# Altium schematic symbol library Analog Devices Data Converters Digital-to-Analog Converters.SchLib: 2231 symbols (part 126 of 135) (continued)
## AD9788BSVZRL (continued)

## AD9789BBC
designator U?
14-Bit Digital-to-Analog Converter, 2400 Msps, -40 to +85 degC, BC-164-1, Tray; Generic Part Number: AD9789; Manufacturer: Analog Devices; PartNumber: AD9789BBC; # DAC Outputs: 1; Max V+: 3.47V; Op Pwr Diss: 1.7W; Resolution (Bits): 14; Settling Time: 13ns; Single Supply: No; DatasheetVersion: Rev.A; PackageVersion: 111808-A; PackageReference: BC-164-1; PackageDescription: 164-Ball Chip Scale Package Ball Grid Array [CSP_BGA]; Supplier 1: Digi-Key; Supplier Part Number 1: AD9789BBC-ND; Supplier 2: Mouser; Supplier Part Number 2: 584-AD9789BBC; Packing: Tray; RoHS: N; Mounting Technology: Surface Mount; Code_JEDEC: MO-219*; ComponentLink1Description: Manufacturer URL; ComponentLink1URL: http://www.analog.com/en/index.html; ComponentLink2Description: Datasheet; ComponentLink2URL: http://www.analog.com/static/imported-files/data_sheets/AD9789.pdf; ComponentLink3Description: Package Specification; ComponentLink3URL: http://www.analog.com/static/imported-files/packages/PKG_PDF/CSPBGA%20(BC)/BC_164_1.pdf; ComponentLink4Description: Product URL; ComponentLink4URL: http://www.analog.com/en/digital-to-analog-converters/da-converters/ad9789/products/product.html
footprint BC-164-1 (BGA, 164-Leads, Body 12x12mm, Pitch 0.8mm)
part A pins: A7 IOUTN (out) "DAC Negative Output Current.", A8 IOUTP (out) "DAC Positive Output Current.", L5 D31/D15P (in) "CMOS/LVDS Data Input.", L6 D27/D13P (in) "CMOS/LVDS Data Input.", L7 D23/D11P (in) "CMOS/LVDS Data Input.", L8 D19/D9P (in) "CMOS/LVDS Data Input.", L9 D15/D7P (in) "CMOS/LVDS Data Input.", L10 D11/D5P (in) "CMOS/LVDS Data Input.", L11 D7/D3P (in) "CMOS/LVDS Data Input.", L12 D3/D1P (in) "CMOS/LVDS Data Input.", M5 D30/D15N (in) "CMOS/LVDS Data Input.", M6 D26/D13N (in) "CMOS/LVDS Data Input.", M7 D22/D11N (in) "CMOS/LVDS Data Input.", M8 D18/D9N (in) "CMOS/LVDS Data Input.", M9 D14/D7N (in) "CMOS/LVDS Data Input.", M10 D10/D5N (in) "CMOS/LVDS Data Input.", M11 D6/D3N (in) "CMOS/LVDS Data Input.", M12 D2/D1N (in) "CMOS/LVDS Data Input.", N5 D29/D14P (in) "CMOS/LVDS Data Input.", N6 D25/D12P (in) "CMOS/LVDS Data Input.", N7 D21/D10P (in) "CMOS/LVDS Data Input.", N8 D17/D8P (in) "CMOS/LVDS Data Input.", N9 D13/D6P (in) "CMOS/LVDS Data Input.", N10 D9/D4P (in) "CMOS/LVDS Data Input.", N11 D5/D2P (in) "CMOS/LVDS Data Input.", N12 D1/D0P (in) "CMOS/LVDS Data Input.", P5 D28/D14N (in) "CMOS/LVDS Data Input.", P6 D24/D12N (in) "CMOS/LVDS Data Input.", P7 D20/D10N (in) "CMOS/LVDS Data Input.", P8 D16/D8N (in) "CMOS/LVDS Data Input.", P9 D12/D6N (in) "CMOS/LVDS Data Input.", P10 D8/D4N (in) "CMOS/LVDS Data Input.", P11 D4/D2N (in) "CMOS/LVDS Data Input.", P12 D0/D0N (in) "CMOS/LVDS Data Input."
part B pins: A14 NC "No Connect. Leave floating.", B14 I120 "Tie this pin to analog ground with a 10 k ohm resistor to generate a 120 uA reference current.", C1 CLKN (in) "Negative DAC Clock Input (DACCLK).", C14 VREF (io) "Band Gap Voltage Reference I/O. Decouple to analog ground with a 1 nF capacitor. Output impedance is approximately 5 k ohm.", D1 CLKP (in) "Positive DAC Clock Input (DACCLK).", D14 IPTAT "Factory Test Pin. Output current, proportional to absolute temperature, is approximately 10 uA at 25 dgeC with a slope of approximately 20 nA/ degC.", L1 ~{CS} (in) "Active Low Chip Select for SPI.", L2 NC "Not Used. Leave unconnected.", L3 NC "Not Used. Leave unconnected.", L4 P1/PARP (in) "CMOS/LVDS Parity Bit.", L13 FSP (out) "Positive LVDS Frame Sync (FSP) for Data Bus.", L14 CMOS_BUS (in) "Active High Input. Configures data bus for CMOS inputs. Low input configures data bus to accept LVDS inputs.", M1 SCLK (in) "Qualifying Clock for SPI.", M2 NC "Not Used. Leave unconnected.", M3 NC "Not Used. Leave unconnected.", M4 P0/PARN (in) "CMOS/LVDS Parity Bit.", M13 FSN (out) "Negative LVDS Frame Sync (FSN) for Data Bus.", M14 CMOS_CTRL (in) "Active High Input. Enables CMOS_DCO and CMOS_FS signals and disables DCOP/DCON and FSP/FSN signals. Low input disables CMOS_DCO and CMOS_FS signals and enables DCOP/DCON and FSP/FSN signals.", N1 SDO (hiz) "Serial Data Output for SPI.", N2 RESET (in) "Active High Input. Resets the AD9789.", N3 NC "Not Used. Leave unconnected.", N4 NC "Not Used. Leave unconnected.", N13 DCOP (out) "Positive LVDS Data Clock Output (DCOP) for Data Bus.", N14 CMOS_FS (in) "CMOS Frame Sync for Data Bus.", P1 SDIO (io) "Serial Data Input/Output for SPI.", P2 ~{IRQ} (oc) "Active Low, Open-Drain Interrupt Request Output. Pull up to DVDD33 with a 10 k ohm resistor.", P3 NC "Not Used. Leave unconnected.", P4 NC "Not Used. Leave unconnected.", P13 DCON (out) "Negative LVDS Data Clock Output (DCON) for Data Bus.", P14 CMOS_DCO (out) "CMOS Data Clock Output for Data Bus."
part C pins: A4 CVDD18 (power) "1.8 V Clock Supply.", A5 CVDD18 (power) "1.8 V Clock Supply.", A12 AVDD33 (power) "3.3 V Analog Supply.", A13 AVDD33 (power) "3.3 V Analog Supply.", B4 CVDD18 (power) "1.8 V Clock Supply.", B5 CVDD18 (power) "1.8 V Clock Supply.", B12 AVDD33 (power) "3.3 V Analog Supply.", B13 AVDD33 (power) "3.3 V Analog Supply.", C4 CVDD18 (power) "1.8 V Clock Supply.", C5 CVDD18 (power) "1.8 V Clock Supply.", C12 AVDD33 (power) "3.3 V Analog Supply.", C13 AVDD33 (power) "3.3 V Analog Supply.", D4 CVDD18 (power) "1.8 V Clock Supply.", D5 CVDD18 (power) "1.8 V Clock Supply.", D12 AVDD33 (power) "3.3 V Analog Supply.", D13 AVDD33 (power) "3.3 V Analog Supply.", E11 DVDD18 (power) "1.8 V Digital Supply.", E12 DVDD18 (power) "1.8 V Digital Supply.", G1 DVDD15 (power) "1.5 V Digital Supply.", G2 DVDD15 (power) "1.5 V Digital Supply.", G3 DVDD15 (power) "1.5 V Digital Supply.", G4 DVDD15 (power) "1.5 V Digital Supply.", G7 DVDD15 (power) "1.5 V Digital Supply.", G8 DVDD15 (power) "1.5 V Digital Supply.", G11 DVDD15 (power) "1.5 V Digital Supply.", G12 DVDD15 (power) "1.5 V Digital Supply.", G13 DVDD15 (power) "1.5 V Digital Supply.", G14 DVDD15 (power) "1.5 V Digital Supply.", K1 DVDD33 (power) "3.3 V Digital Supply.", K2 DVDD33 (power) "3.3 V Digital Supply.", K3 DVDD33 (power) "3.3 V Digital Supply.", K4 DVDD33 (power) "3.3 V Digital Supply.", K11 DVDD33 (power) "3.3 V Digital Supply.", K12 DVDD33 (power) "3.3 V Digital Supply.", K13 DVDD33 (power) "3.3 V Digital Supply.", K14 DVDD33 (power) "3.3 V Digital Supply."
part D pins: A1 AVSS (power) "Analog Supply Ground.", A2 AVSS (power) "Analog Supply Ground.", A3 AVSS (power) "Analog Supply Ground.", A6 AVSS (power) "Analog Supply Ground.", A9 AVSS (power) "Analog Supply Ground.", A10 AVSS (power) "Analog Supply Ground.", A11 AVSS (power) "Analog Supply Ground.", B1 AVSS (power) "Analog Supply Ground.", B2 AVSS (power) "Analog Supply Ground.", B3 AVSS (power) "Analog Supply Ground.", B6 AVSS (power) "Analog Supply Ground.", B7 AVSS (power) "Analog Supply Ground.", B8 AVSS (power) "Analog Supply Ground.", B9 AVSS (power) "Analog Supply Ground.", B10 AVSS (power) "Analog Supply Ground.", B11 AVSS (power) "Analog Supply Ground.", C2 AVSS (power) "Analog Supply Ground.", C3 AVSS (power) "Analog Supply Ground.", C6 AVSS (power) "Analog Supply Ground.", C7 AVSS (power) "Analog Supply Ground.", C8 AVSS (power) "Analog Supply Ground.", C9 AVSS (power) "Analog Supply Ground.", C10 AVSS (power) "Analog Supply Ground.", C11 AVSS (power) "Analog Supply Ground.", D2 AVSS (power) "Analog Supply Ground.", D3 AVSS (power) "Analog Supply Ground.", D6 AVSS (power) "Analog Supply Ground.", D7 AVSS (power) "Analog Supply Ground.", D8 AVSS (power) "Analog Supply Ground.", D9 AVSS (power) "Analog Supply Ground.", D10 AVSS (power) "Analog Supply Ground.", D11 AVSS (power) "Analog Supply Ground.", E1 AVSS (power) "Analog Supply Ground.", E2 AVSS (power) "Analog Supply Ground.", E3 AVSS (power) "Analog Supply Ground.", E4 AVSS (power) "Analog Supply Ground.", E13 AVSS (power) "Analog Supply Ground.", E14 AVSS (power) "Analog Supply Ground.", F1 AVSS (power) "Analog Supply Ground.", F2 AVSS (power) "Analog Supply Ground.", F3 AVSS (power) "Analog Supply Ground.", F4 AVSS (power) "Analog Supply Ground.", F11 AVSS (power) "Analog Supply Ground.", F12 AVSS (power) "Analog Supply Ground.", F13 AVSS (power) "Analog Supply Ground.", F14 AVSS (power) "Analog Supply Ground.", H1 DVSS (power) "Digital Supply Ground.", H2 DVSS (power) "Digital Supply Ground.", H3 DVSS (power) "Digital Supply Ground.", H4 DVSS (power) "Digital Supply Ground.", H7 DVSS (power) "Digital Supply Ground.", H8 DVSS (power) "Digital Supply Ground.", H11 DVSS (power) "Digital Supply Ground.", H12 DVSS (power) "Digital Supply Ground.", H13 DVSS (power) "Digital Supply Ground.", H14 DVSS (power) "Digital Supply Ground.", J1 DVSS (power) "Digital Supply Ground.", J2 DVSS (power) "Digital Supply Ground.", J3 DVSS (power) "Digital Supply Ground.", J4 DVSS (power) "Digital Supply Ground.", J11 DVSS (power) "Digital Supply Ground.", J12 DVSS (power) "Digital Supply Ground.", J13 DVSS (power) "Digital Supply Ground.", J14 DVSS (power) "Digital Supply Ground."

## AD9789BBCRL
designator U?
14-Bit Digital-to-Analog Converter, 2400 Msps, -40 to +85 degC, BC-164-1, Reel; Generic Part Number: AD9789; Manufacturer: Analog Devices; PartNumber: AD9789BBCRL; # DAC Outputs: 1; Max V+: 3.47V; Op Pwr Diss: 1.7W; Resolution (Bits): 14; Settling Time: 13ns; Single Supply: No; DatasheetVersion: Rev.A; PackageVersion: 111808-A; PackageReference: BC-164-1; PackageDescription: 164-Ball Chip Scale Package Ball Grid Array [CSP_BGA]; Supplier 1: Digi-Key; Supplier Part Number 1: AD9789BBCRL-ND; Supplier 2: Mouser; Supplier Part Number 2: 584-AD9789BBCR; Packing: Reel; RoHS: N; Mounting Technology: Surface Mount; Code_JEDEC: MO-219*; ComponentLink1Description: Manufacturer URL; ComponentLink1URL: http://www.analog.com/en/index.html; ComponentLink2Description: Datasheet; ComponentLink2URL: http://www.analog.com/static/imported-files/data_sheets/AD9789.pdf; ComponentLink3Description: Package Specification; ComponentLink3URL: http://www.analog.com/static/imported-files/packages/PKG_PDF/CSPBGA%20(BC)/BC_164_1.pdf; ComponentLink4Description: Product URL; ComponentLink4URL: http://www.analog.com/en/digital-to-analog-converters/da-converters/ad9789/products/product.html
footprint BC-164-1 (BGA, 164-Leads, Body 12x12mm, Pitch 0.8mm)
part A pins: A7 IOUTN (out) "DAC Negative Output Current.", A8 IOUTP (out) "DAC Positive Output Current.", L5 D31/D15P (in) "CMOS/LVDS Data Input.", L6 D27/D13P (in) "CMOS/LVDS Data Input.", L7 D23/D11P (in) "CMOS/LVDS Data Input.", L8 D19/D9P (in) "CMOS/LVDS Data Input.", L9 D15/D7P (in) "CMOS/LVDS Data Input.", L10 D11/D5P (in) "CMOS/LVDS Data Input.", L11 D7/D3P (in) "CMOS/LVDS Data Input.", L12 D3/D1P (in) "CMOS/LVDS Data Input.", M5 D30/D15N (in) "CMOS/LVDS Data Input.", M6 D26/D13N (in) "CMOS/LVDS Data Input.", M7 D22/D11N (in) "CMOS/LVDS Data Input.", M8 D18/D9N (in) "CMOS/LVDS Data Input.", M9 D14/D7N (in) "CMOS/LVDS Data Input.", M10 D10/D5N (in) "CMOS/LVDS Data Input.", M11 D6/D3N (in) "CMOS/LVDS Data Input.", M12 D2/D1N (in) "CMOS/LVDS Data Input.", N5 D29/D14P (in) "CMOS/LVDS Data Input.", N6 D25/D12P (in) "CMOS/LVDS Data Input.", N7 D21/D10P (in) "CMOS/LVDS Data Input.", N8 D17/D8P (in) "CMOS/LVDS Data Input.", N9 D13/D6P (in) "CMOS/LVDS Data Input.", N10 D9/D4P (in) "CMOS/LVDS Data Input.", N11 D5/D2P (in) "CMOS/LVDS Data Input.", N12 D1/D0P (in) "CMOS/LVDS Data Input.", P5 D28/D14N (in) "CMOS/LVDS Data Input.", P6 D24/D12N (in) "CMOS/LVDS Data Input.", P7 D20/D10N (in) "CMOS/LVDS Data Input.", P8 D16/D8N (in) "CMOS/LVDS Data Input.", P9 D12/D6N (in) "CMOS/LVDS Data Input.", P10 D8/D4N (in) "CMOS/LVDS Data Input.", P11 D4/D2N (in) "CMOS/LVDS Data Input.", P12 D0/D0N (in) "CMOS/LVDS Data Input."
part B pins: A14 NC "No Connect. Leave floating.", B14 I120 "Tie this pin to analog ground with a 10 k ohm resistor to generate a 120 uA reference current.", C1 CLKN (in) "Negative DAC Clock Input (DACCLK).", C14 VREF (io) "Band Gap Voltage Reference I/O. Decouple to analog ground with a 1 nF capacitor. Output impedance is approximately 5 k ohm.", D1 CLKP (in) "Positive DAC Clock Input (DACCLK).", D14 IPTAT "Factory Test Pin. Output current, proportional to absolute temperature, is approximately 10 uA at 25 dgeC with a slope of approximately 20 nA/ degC.", L1 ~{CS} (in) "Active Low Chip Select for SPI.", L2 NC "Not Used. Leave unconnected.", L3 NC "Not Used. Leave unconnected.", L4 P1/PARP (in) "CMOS/LVDS Parity Bit.", L13 FSP (out) "Positive LVDS Frame Sync (FSP) for Data Bus.", L14 CMOS_BUS (in) "Active High Input. Configures data bus for CMOS inputs. Low input configures data bus to accept LVDS inputs.", M1 SCLK (in) "Qualifying Clock for SPI.", M2 NC "Not Used. Leave unconnected.", M3 NC "Not Used. Leave unconnected.", M4 P0/PARN (in) "CMOS/LVDS Parity Bit.", M13 FSN (out) "Negative LVDS Frame Sync (FSN) for Data Bus.", M14 CMOS_CTRL (in) "Active High Input. Enables CMOS_DCO and CMOS_FS signals and disables DCOP/DCON and FSP/FSN signals. Low input disables CMOS_DCO and CMOS_FS signals and enables DCOP/DCON and FSP/FSN signals.", N1 SDO (hiz) "Serial Data Output for SPI.", N2 RESET (in) "Active High Input. Resets the AD9789.", N3 NC "Not Used. Leave unconnected.", N4 NC "Not Used. Leave unconnected.", N13 DCOP (out) "Positive LVDS Data Clock Output (DCOP) for Data Bus.", N14 CMOS_FS (in) "CMOS Frame Sync for Data Bus.", P1 SDIO (io) "Serial Data Input/Output for SPI.", P2 ~{IRQ} (oc) "Active Low, Open-Drain Interrupt Request Output. Pull up to DVDD33 with a 10 k ohm resistor.", P3 NC "Not Used. Leave unconnected.", P4 NC "Not Used. Leave unconnected.", P13 DCON (out) "Negative LVDS Data Clock Output (DCON) for Data Bus.", P14 CMOS_DCO (out) "CMOS Data Clock Output for Data Bus."
part C pins: A4 CVDD18 (power) "1.8 V Clock Supply.", A5 CVDD18 (power) "1.8 V Clock Supply.", A12 AVDD33 (power) "3.3 V Analog Supply.", A13 AVDD33 (power) "3.3 V Analog Supply.", B4 CVDD18 (power) "1.8 V Clock Supply.", B5 CVDD18 (power) "1.8 V Clock Supply.", B12 AVDD33 (power) "3.3 V Analog Supply.", B13 AVDD33 (power) "3.3 V Analog Supply.", C4 CVDD18 (power) "1.8 V Clock Supply.", C5 CVDD18 (power) "1.8 V Clock Supply.", C12 AVDD33 (power) "3.3 V Analog Supply.", C13 AVDD33 (power) "3.3 V Analog Supply.", D4 CVDD18 (power) "1.8 V Clock Supply.", D5 CVDD18 (power) "1.8 V Clock Supply.", D12 AVDD33 (power) "3.3 V Analog Supply.", D13 AVDD33 (power) "3.3 V Analog Supply.", E11 DVDD18 (power) "1.8 V Digital Supply.", E12 DVDD18 (power) "1.8 V Digital Supply.", G1 DVDD15 (power) "1.5 V Digital Supply.", G2 DVDD15 (power) "1.5 V Digital Supply.", G3 DVDD15 (power) "1.5 V Digital Supply.", G4 DVDD15 (power) "1.5 V Digital Supply.", G7 DVDD15 (power) "1.5 V Digital Supply.", G8 DVDD15 (power) "1.5 V Digital Supply.", G11 DVDD15 (power) "1.5 V Digital Supply.", G12 DVDD15 (power) "1.5 V Digital Supply.", G13 DVDD15 (power) "1.5 V Digital Supply.", G14 DVDD15 (power) "1.5 V Digital Supply.", K1 DVDD33 (power) "3.3 V Digital Supply.", K2 DVDD33 (power) "3.3 V Digital Supply.", K3 DVDD33 (power) "3.3 V Digital Supply.", K4 DVDD33 (power) "3.3 V Digital Supply.", K11 DVDD33 (power) "3.3 V Digital Supply.", K12 DVDD33 (power) "3.3 V Digital Supply.", K13 DVDD33 (power) "3.3 V Digital Supply.", K14 DVDD33 (power) "3.3 V Digital Supply."
part D pins: A1 AVSS (power) "Analog Supply Ground.", A2 AVSS (power) "Analog Supply Ground.", A3 AVSS (power) "Analog Supply Ground.", A6 AVSS (power) "Analog Supply Ground.", A9 AVSS (power) "Analog Supply Ground.", A10 AVSS (power) "Analog Supply Ground.", A11 AVSS (power) "Analog Supply Ground.", B1 AVSS (power) "Analog Supply Ground.", B2 AVSS (power) "Analog Supply Ground.", B3 AVSS (power) "Analog Supply Ground.", B6 AVSS (power) "Analog Supply Ground.", B7 AVSS (power) "Analog Supply Ground.", B8 AVSS (power) "Analog Supply Ground.", B9 AVSS (power) "Analog Supply Ground.", B10 AVSS (power) "Analog Supply Ground.", B11 AVSS (power) "Analog Supply Ground.", C2 AVSS (power) "Analog Supply Ground.", C3 AVSS (power) "Analog Supply Ground.", C6 AVSS (power) "Analog Supply Ground.", C7 AVSS (power) "Analog Supply Ground.", C8 AVSS (power) "Analog Supply Ground.", C9 AVSS (power) "Analog Supply Ground.", C10 AVSS (power) "Analog Supply Ground.", C11 AVSS (power) "Analog Supply Ground.", D2 AVSS (power) "Analog Supply Ground.", D3 AVSS (power) "Analog Supply Ground.", D6 AVSS (power) "Analog Supply Ground.", D7 AVSS (power) "Analog Supply Ground.", D8 AVSS (power) "Analog Supply Ground.", D9 AVSS (power) "Analog Supply Ground.", D10 AVSS (power) "Analog Supply Ground.", D11 AVSS (power) "Analog Supply Ground.", E1 AVSS (power) "Analog Supply Ground.", E2 AVSS (power) "Analog Supply Ground.", E3 AVSS (power) "Analog Supply Ground.", E4 AVSS (power) "Analog Supply Ground.", E13 AVSS (power) "Analog Supply Ground.", E14 AVSS (power) "Analog Supply Ground.", F1 AVSS (power) "Analog Supply Ground.", F2 AVSS (power) "Analog Supply Ground.", F3 AVSS (power) "Analog Supply Ground.", F4 AVSS (power) "Analog Supply Ground.", F11 AVSS (power) "Analog Supply Ground.", F12 AVSS (power) "Analog Supply Ground.", F13 AVSS (power) "Analog Supply Ground.", F14 AVSS (power) "Analog Supply Ground.", H1 DVSS (power) "Digital Supply Ground.", H2 DVSS (power) "Digital Supply Ground.", H3 DVSS (power) "Digital Supply Ground.", H4 DVSS (power) "Digital Supply Ground.", H7 DVSS (power) "Digital Supply Ground.", H8 DVSS (power) "Digital Supply Ground.", H11 DVSS (power) "Digital Supply Ground.", H12 DVSS (power) "Digital Supply Ground.", H13 DVSS (power) "Digital Supply Ground.", H14 DVSS (power) "Digital Supply Ground.", J1 DVSS (power) "Digital Supply Ground.", J2 DVSS (power) "Digital Supply Ground.", J3 DVSS (power) "Digital Supply Ground.", J4 DVSS (power) "Digital Supply Ground.", J11 DVSS (power) "Digital Supply Ground.", J12 DVSS (power) "Digital Supply Ground.", J13 DVSS (power) "Digital Supply Ground.", J14 DVSS (power) "Digital Supply Ground."

## AD9789BBCZ
designator U?
Single 14-Bit Digital-to-Analog Converter, 2400 Msps, -40 to +85 degC, BC-164-1, Pb-Free, Tray; Generic Part Number: AD9789; Manufacturer: Analog Devices; PartNumber: AD9789BBCZ; # DAC Outputs: 1; Max V+: 3.47V; Op Pwr Diss: 1.7W; Resolution (Bits): 14; Settling Time: 13ns; Single Supply: No; DatasheetVersion: Rev.A; PackageVersion: 111808-A; PackageReference: BC-164-1; PackageDescription: 164-Ball Chip Scale Package Ball Grid Array [CSP_BGA]; Supplier 1: Digi-Key; Supplier Part Number 1: AD9789BBCZ-ND; Supplier 2: Farnell; Supplier Part Number 2: 2074860; Supplier 3: Newark; Supplier Part Number 3: 05R6618; Supplier 4: Mouser; Supplier Part Number 4: 584-AD9789BBCZ; Packing: Tray; RoHS: Y; Mounting Technology: Surface Mount; Code_JEDEC: MO-219*; ComponentLink1Description: Manufacturer URL; ComponentLink1URL: http://www.analog.com/en/index.html; ComponentLink2Description: Datasheet; ComponentLink2URL: http://www.analog.com/static/imported-files/data_sheets/AD9789.pdf; ComponentLink3Description: Package Specification; ComponentLink3URL: http://www.analog.com/static/imported-files/packages/PKG_PDF/CSPBGA%20(BC)/BC_164_1.pdf; ComponentLink4Description: Product URL; ComponentLink4URL: http://www.analog.com/en/digital-to-analog-converters/da-converters/ad9789/products/product.html
footprint BC-164-1 (BGA, 164-Leads, Body 12x12mm, Pitch 0.8mm)
part A pins: A7 IOUTN (out) "DAC Negative Output Current.", A8 IOUTP (out) "DAC Positive Output Current.", L5 D31/D15P (in) "CMOS/LVDS Data Input.", L6 D27/D13P (in) "CMOS/LVDS Data Input.", L7 D23/D11P (in) "CMOS/LVDS Data Input.", L8 D19/D9P (in) "CMOS/LVDS Data Input.", L9 D15/D7P (in) "CMOS/LVDS Data Input.", L10 D11/D5P (in) "CMOS/LVDS Data Input.", L11 D7/D3P (in) "CMOS/LVDS Data Input.", L12 D3/D1P (in) "CMOS/LVDS Data Input.", M5 D30/D15N (in) "CMOS/LVDS Data Input.", M6 D26/D13N (in) "CMOS/LVDS Data Input.", M7 D22/D11N (in) "CMOS/LVDS Data Input.", M8 D18/D9N (in) "CMOS/LVDS Data Input.", M9 D14/D7N (in) "CMOS/LVDS Data Input.", M10 D10/D5N (in) "CMOS/LVDS Data Input.", M11 D6/D3N (in) "CMOS/LVDS Data Input.", M12 D2/D1N (in) "CMOS/LVDS Data Input.", N5 D29/D14P (in) "CMOS/LVDS Data Input.", N6 D25/D12P (in) "CMOS/LVDS Data Input.", N7 D21/D10P (in) "CMOS/LVDS Data Input.", N8 D17/D8P (in) "CMOS/LVDS Data Input.", N9 D13/D6P (in) "CMOS/LVDS Data Input.", N10 D9/D4P (in) "CMOS/LVDS Data Input.", N11 D5/D2P (in) "CMOS/LVDS Data Input.", N12 D1/D0P (in) "CMOS/LVDS Data Input.", P5 D28/D14N (in) "CMOS/LVDS Data Input.", P6 D24/D12N (in) "CMOS/LVDS Data Input.", P7 D20/D10N (in) "CMOS/LVDS Data Input.", P8 D16/D8N (in) "CMOS/LVDS Data Input.", P9 D12/D6N (in) "CMOS/LVDS Data Input.", P10 D8/D4N (in) "CMOS/LVDS Data Input.", P11 D4/D2N (in) "CMOS/LVDS Data Input.", P12 D0/D0N (in) "CMOS/LVDS Data Input."
part B pins: A14 NC "No Connect. Leave floating.", B14 I120 "Tie this pin to analog ground with a 10 k ohm resistor to generate a 120 uA reference current.", C1 CLKN (in) "Negative DAC Clock Input (DACCLK).", C14 VREF (io) "Band Gap Voltage Reference I/O. Decouple to analog ground with a 1 nF capacitor. Output impedance is approximately 5 k ohm.", D1 CLKP (in) "Positive DAC Clock Input (DACCLK).", D14 IPTAT "Factory Test Pin. Output current, proportional to absolute temperature, is approximately 10 uA at 25 dgeC with a slope of approximately 20 nA/ degC.", L1 ~{CS} (in) "Active Low Chip Select for SPI.", L2 NC "Not Used. Leave unconnected.", L3 NC "Not Used. Leave unconnected.", L4 P1/PARP (in) "CMOS/LVDS Parity Bit.", L13 FSP (out) "Positive LVDS Frame Sync (FSP) for Data Bus.", L14 CMOS_BUS (in) "Active High Input. Configures data bus for CMOS inputs. Low input configures data bus to accept LVDS inputs.", M1 SCLK (in) "Qualifying Clock for SPI.", M2 NC "Not Used. Leave unconnected.", M3 NC "Not Used. Leave unconnected.", M4 P0/PARN (in) "CMOS/LVDS Parity Bit.", M13 FSN (out) "Negative LVDS Frame Sync (FSN) for Data Bus.", M14 CMOS_CTRL (in) "Active High Input. Enables CMOS_DCO and CMOS_FS signals and disables DCOP/DCON and FSP/FSN signals. Low input disables CMOS_DCO and CMOS_FS signals and enables DCOP/DCON and FSP/FSN signals.", N1 SDO (hiz) "Serial Data Output for SPI.", N2 RESET (in) "Active High Input. Resets the AD9789.", N3 NC "Not Used. Leave unconnected.", N4 NC "Not Used. Leave unconnected.", N13 DCOP (out) "Positive LVDS Data Clock Output (DCOP) for Data Bus.", N14 CMOS_FS (in) "CMOS Frame Sync for Data Bus.", P1 SDIO (io) "Serial Data Input/Output for SPI.", P2 ~{IRQ} (oc) "Active Low, Open-Drain Interrupt Request Output. Pull up to DVDD33 with a 10 k ohm resistor.", P3 NC "Not Used. Leave unconnected.", P4 NC "Not Used. Leave unconnected.", P13 DCON (out) "Negative LVDS Data Clock Output (DCON) for Data Bus.", P14 CMOS_DCO (out) "CMOS Data Clock Output for Data Bus."
part C pins: A4 CVDD18 (power) "1.8 V Clock Supply.", A5 CVDD18 (power) "1.8 V Clock Supply.", A12 AVDD33 (power) "3.3 V Analog Supply.", A13 AVDD33 (power) "3.3 V Analog Supply.", B4 CVDD18 (power) "1.8 V Clock Supply.", B5 CVDD18 (power) "1.8 V Clock Supply.", B12 AVDD33 (power) "3.3 V Analog Supply.", B13 AVDD33 (power) "3.3 V Analog Supply.", C4 CVDD18 (power) "1.8 V Clock Supply.", C5 CVDD18 (power) "1.8 V Clock Supply.", C12 AVDD33 (power) "3.3 V Analog Supply.", C13 AVDD33 (power) "3.3 V Analog Supply.", D4 CVDD18 (power) "1.8 V Clock Supply.", D5 CVDD18 (power) "1.8 V Clock Supply.", D12 AVDD33 (power) "3.3 V Analog Supply.", D13 AVDD33 (power) "3.3 V Analog Supply.", E11 DVDD18 (power) "1.8 V Digital Supply.", E12 DVDD18 (power) "1.8 V Digital Supply.", G1 DVDD15 (power) "1.5 V Digital Supply.", G2 DVDD15 (power) "1.5 V Digital Supply.", G3 DVDD15 (power) "1.5 V Digital Supply.", G4 DVDD15 (power) "1.5 V Digital Supply.", G7 DVDD15 (power) "1.5 V Digital Supply.", G8 DVDD15 (power) "1.5 V Digital Supply.", G11 DVDD15 (power) "1.5 V Digital Supply.", G12 DVDD15 (power) "1.5 V Digital Supply.", G13 DVDD15 (power) "1.5 V Digital Supply.", G14 DVDD15 (power) "1.5 V Digital Supply.", K1 DVDD33 (power) "3.3 V Digital Supply.", K2 DVDD33 (power) "3.3 V Digital Supply.", K3 DVDD33 (power) "3.3 V Digital Supply.", K4 DVDD33 (power) "3.3 V Digital Supply.", K11 DVDD33 (power) "3.3 V Digital Supply.", K12 DVDD33 (power) "3.3 V Digital Supply.", K13 DVDD33 (power) "3.3 V Digital Supply.", K14 DVDD33 (power) "3.3 V Digital Supply."
part D pins: A1 AVSS (power) "Analog Supply Ground.", A2 AVSS (power) "Analog Supply Ground.", A3 AVSS (power) "Analog Supply Ground.", A6 AVSS (power) "Analog Supply Ground.", A9 AVSS (power) "Analog Supply Ground.", A10 AVSS (power) "Analog Supply Ground.", A11 AVSS (power) "Analog Supply Ground.", B1 AVSS (power) "Analog Supply Ground.", B2 AVSS (power) "Analog Supply Ground.", B3 AVSS (power) "Analog Supply Ground.", B6 AVSS (power) "Analog Supply Ground.", B7 AVSS (power) "Analog Supply Ground.", B8 AVSS (power) "Analog Supply Ground.", B9 AVSS (power) "Analog Supply Ground.", B10 AVSS (power) "Analog Supply Ground.", B11 AVSS (power) "Analog Supply Ground.", C2 AVSS (power) "Analog Supply Ground.", C3 AVSS (power) "Analog Supply Ground.", C6 AVSS (power) "Analog Supply Ground.", C7 AVSS (power) "Analog Supply Ground.", C8 AVSS (power) "Analog Supply Ground.", C9 AVSS (power) "Analog Supply Ground.", C10 AVSS (power) "Analog Supply Ground.", C11 AVSS (power) "Analog Supply Ground.", D2 AVSS (power) "Analog Supply Ground.", D3 AVSS (power) "Analog Supply Ground.", D6 AVSS (power) "Analog Supply Ground.", D7 AVSS (power) "Analog Supply Ground.", D8 AVSS (power) "Analog Supply Ground.", D9 AVSS (power) "Analog Supply Ground.", D10 AVSS (power) "Analog Supply Ground.", D11 AVSS (power) "Analog Supply Ground.", E1 AVSS (power) "Analog Supply Ground.", E2 AVSS (power) "Analog Supply Ground.", E3 AVSS (power) "Analog Supply Ground.", E4 AVSS (power) "Analog Supply Ground.", E13 AVSS (power) "Analog Supply Ground.", E14 AVSS (power) "Analog Supply Ground.", F1 AVSS (power) "Analog Supply Ground.", F2 AVSS (power) "Analog Supply Ground.", F3 AVSS (power) "Analog Supply Ground.", F4 AVSS (power) "Analog Supply Ground.", F11 AVSS (power) "Analog Supply Ground.", F12 AVSS (power) "Analog Supply Ground.", F13 AVSS (power) "Analog Supply Ground.", F14 AVSS (power) "Analog Supply Ground.", H1 DVSS (power) "Digital Supply Ground.", H2 DVSS (power) "Digital Supply Ground.", H3 DVSS (power) "Digital Supply Ground.", H4 DVSS (power) "Digital Supply Ground.", H7 DVSS (power) "Digital Supply Ground.", H8 DVSS (power) "Digital Supply Ground.", H11 DVSS (power) "Digital Supply Ground.", H12 DVSS (power) "Digital Supply Ground.", H13 DVSS (power) "Digital Supply Ground.", H14 DVSS (power) "Digital Supply Ground.", J1 DVSS (power) "Digital Supply Ground.", J2 DVSS (power) "Digital Supply Ground.", J3 DVSS (power) "Digital Supply Ground.", J4 DVSS (power) "Digital Supply Ground.", J11 DVSS (power) "Digital Supply Ground.", J12 DVSS (power) "Digital Supply Ground.", J13 DVSS (power) "Digital Supply Ground.", J14 DVSS (power) "Digital Supply Ground."

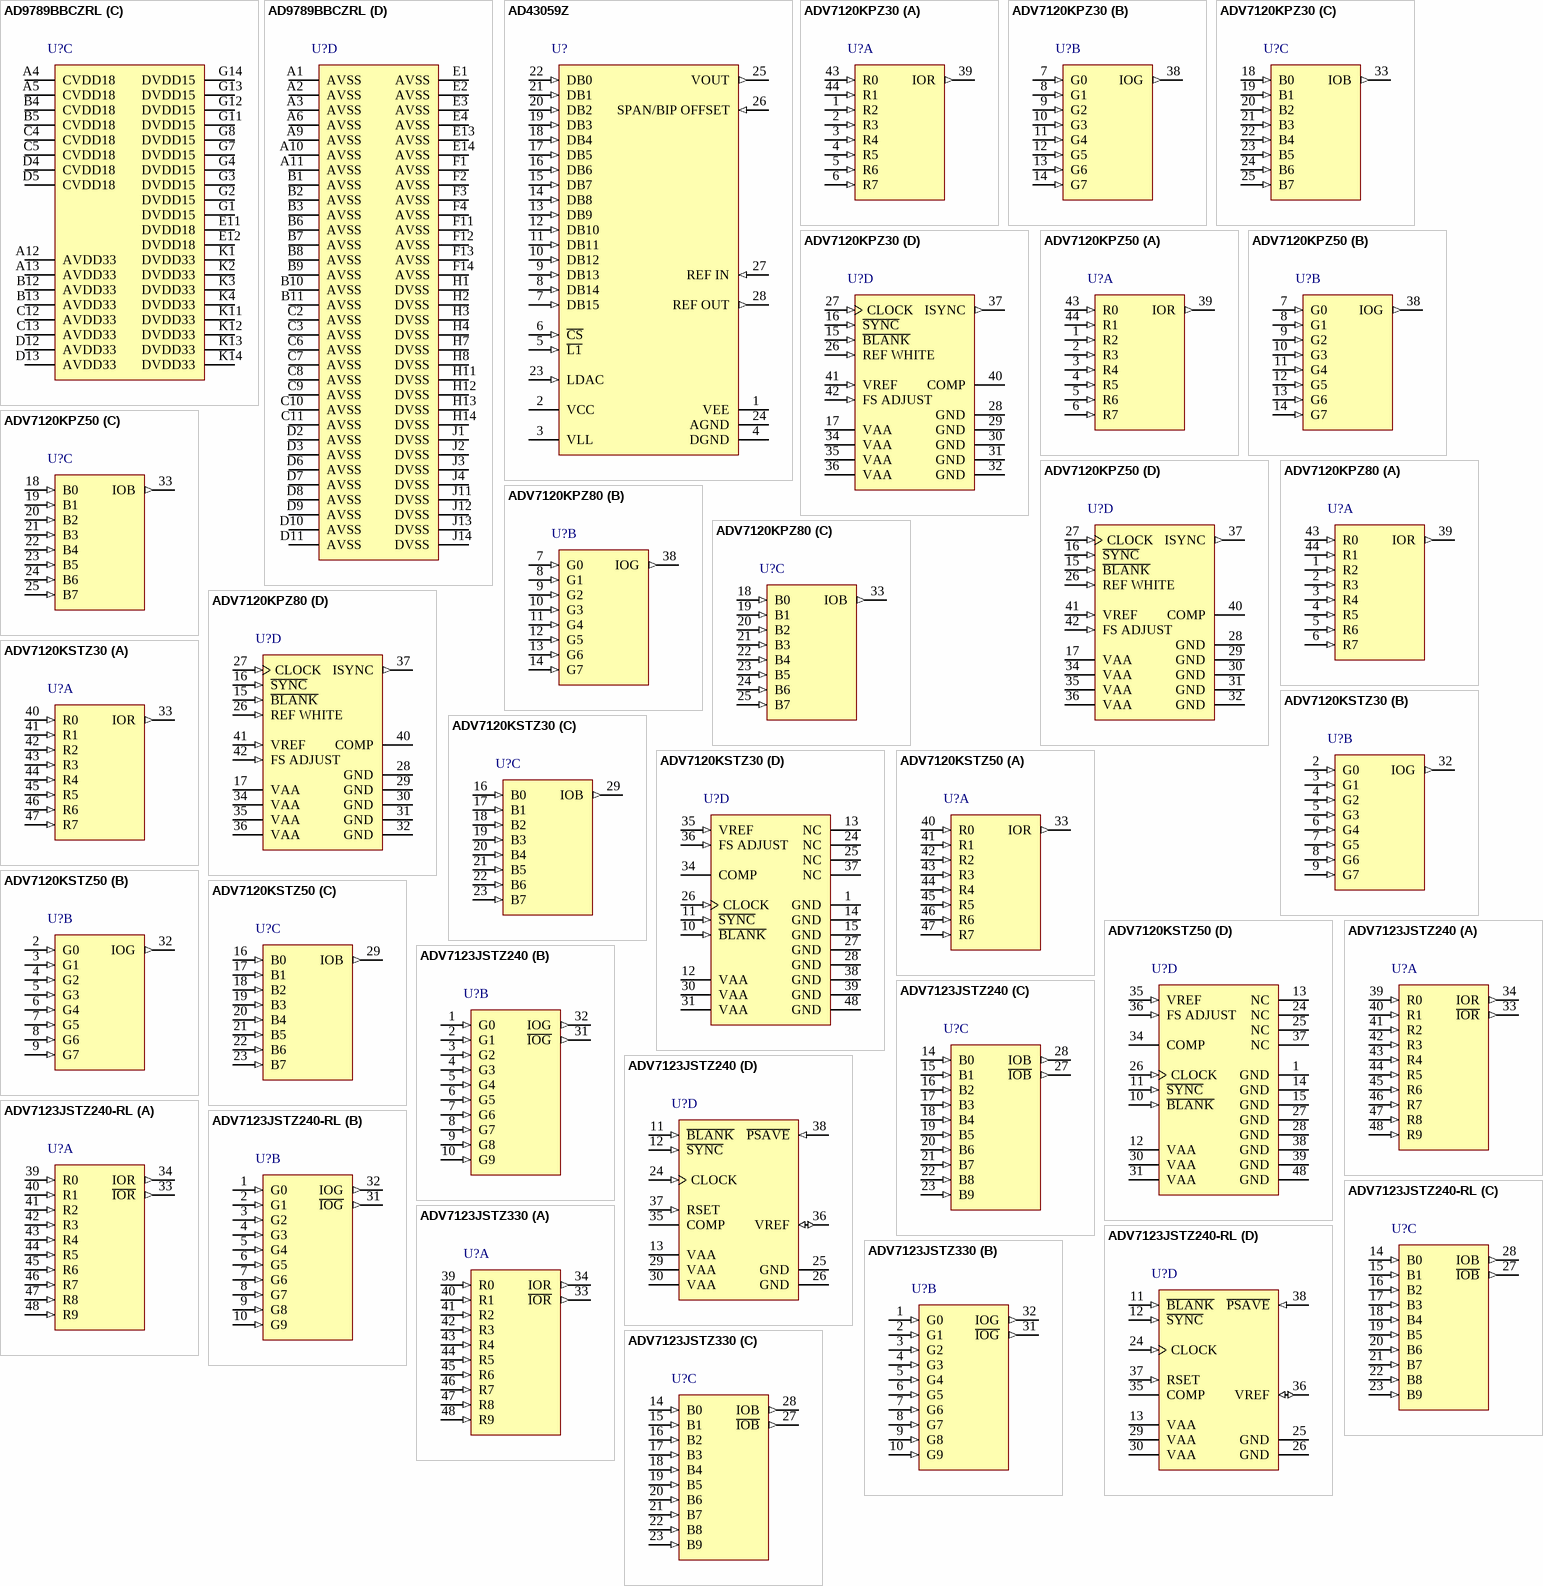
[diagram p107: symbols AD9789BBCZRL to ADV7123JSTZ330]